# Altium footprint library BBC_Connectors.PcbLib: 142 footprints (part 9 of 9)
Each footprint in its own frame and in the unit in brackets; x right, y up, seen from the top. Pads: shape width x height; smd on the part's side, far side on the other; paste and mask are expansions set on the pad; w line width, h text height; cw(c..) or ccw(c..) is an arc to the next point about the centre after c.
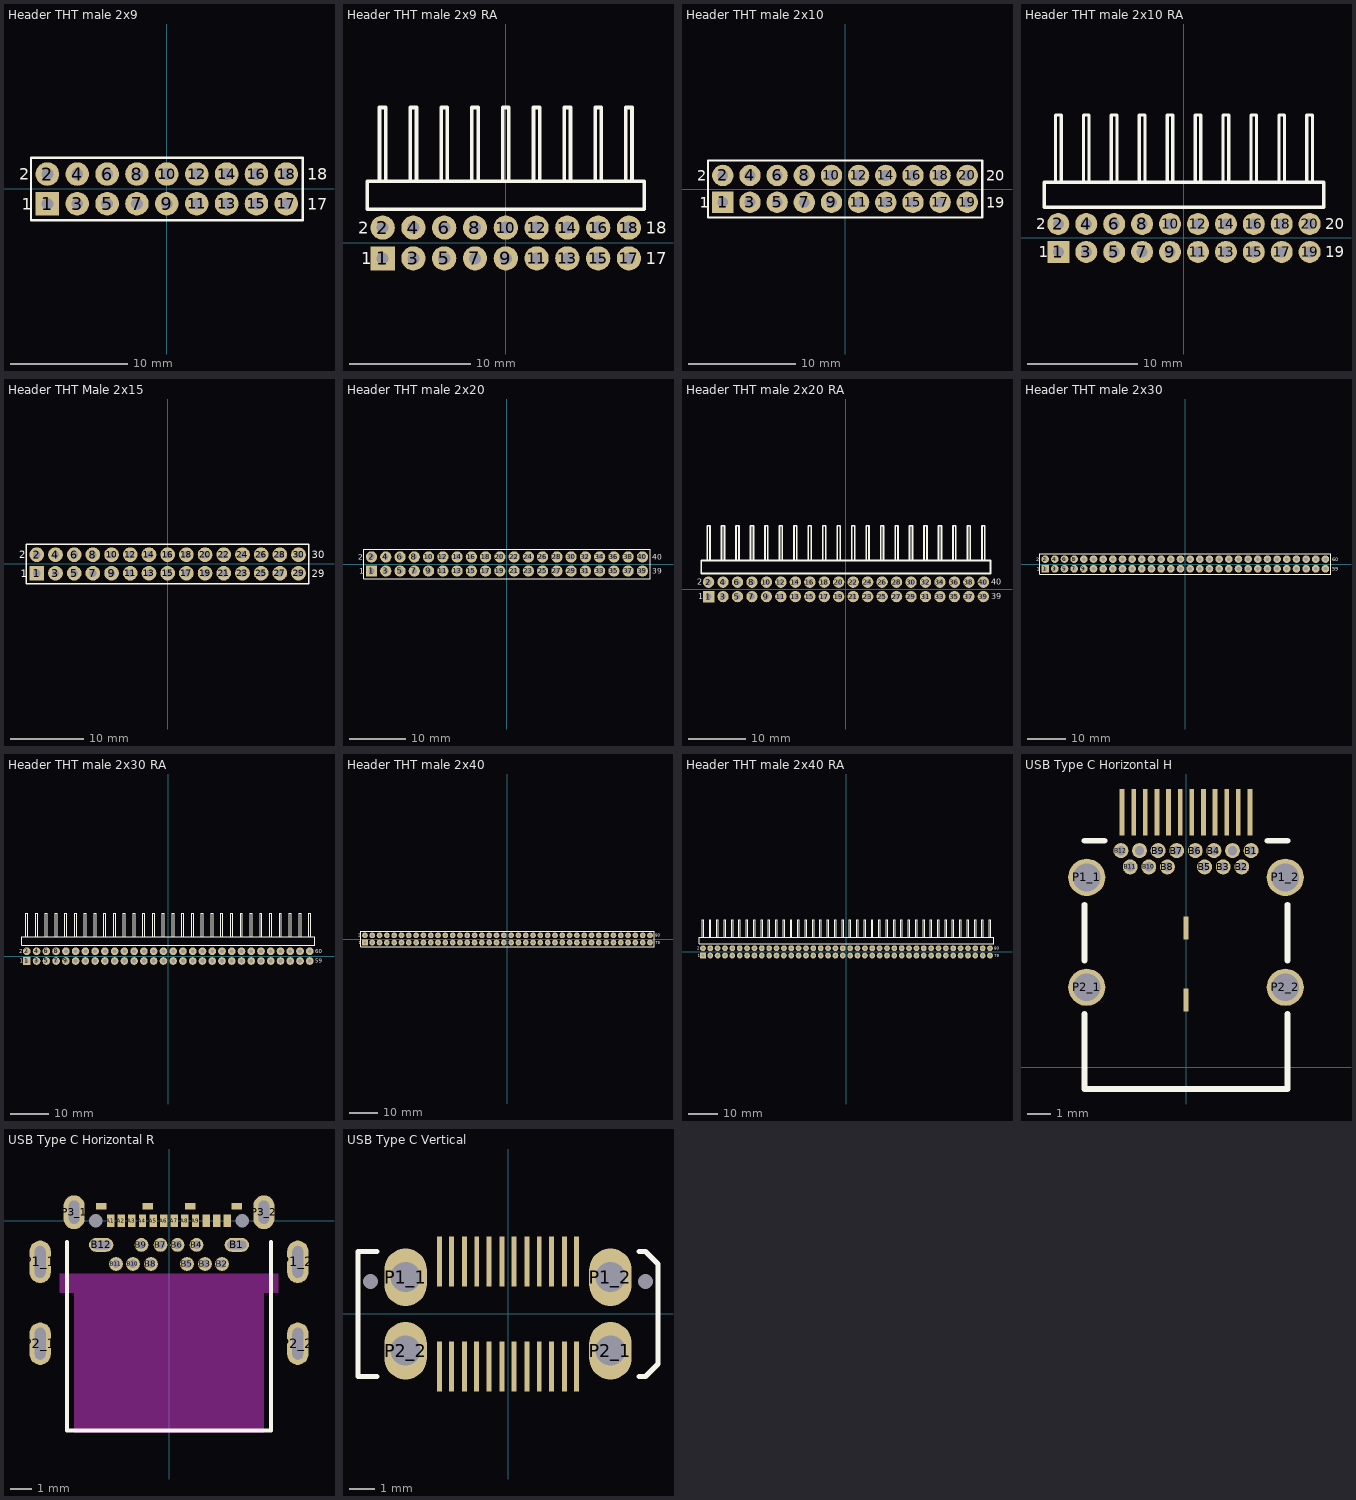
[diagram p8: the footprints below, top view; thin cyan lines are the x and y axes]

## Header THT male 2x9 [mm] "header for tht mounting / pitch = 2.54mm"
height 9
pads (18):
  rect 2x2 hole 1: 1(-10.16,-1.245)
  round 2 hole 1: 2(-10.16,1.27) 3(-7.62,-1.245) 4(-7.62,1.27) 5(-5.08,-1.245) 6(-5.08,1.27) 7(-2.54,-1.245) 8(-2.54,1.27) 9(0,-1.245) 10(0,1.27) 11(2.54,-1.245) 12(2.54,1.27) 13(5.08,-1.245) 14(5.08,1.27) 15(7.62,-1.245) 16(7.62,1.27) 17(10.16,-1.245) 18(10.16,1.27)
Top Overlay:
  lines w0.2: -11.557,-2.667 11.557,-2.667 11.557,2.667 -11.557,2.667 -11.557,-2.667
  text "2" at -12.573,0.77 h1
  text "18" at 11.938,0.77 h1
  text "17" at 11.938,-1.77 h1
  text "1" at -12.319,-1.77 h1
3D body: height 2.51, standoff -3, extent 2.54,3.81 2.54,3.81
3D body "Header THT 2x9.step": height 8.54, standoff -3, extent -11.43,-2.49 11.43,2.5

## Header THT male 2x9 RA [mm] "right angle header for tht mounting / pitch = 2.54mm"
height 2.5
pads (18):
  rect 2x2 hole 1: 1(-10.16,-1.27)
  round 2 hole 1: 2(-10.16,1.27) 3(-7.62,-1.27) 4(-7.62,1.27) 5(-5.08,-1.27) 6(-5.08,1.27) 7(-2.54,-1.27) 8(-2.54,1.27) 9(0,-1.27) 10(0,1.27) 11(2.54,-1.27) 12(2.54,1.27) 13(5.08,-1.27) 14(5.08,1.27) 15(7.62,-1.27) 16(7.62,1.27) 17(10.16,-1.27) 18(10.16,1.27)
Top Overlay:
  lines w0.3: -10.414,5.08 -10.414,11.176 -9.906,11.176 -9.906,5.08 ; -7.874,5.08 -7.874,11.176 -7.366,11.176 -7.366,5.08 ; -5.334,5.08 -5.334,11.176 -4.826,11.176 -4.826,5.08 ; -2.794,5.08 -2.794,11.176 -2.286,11.176 -2.286,5.08 ; -0.254,5.08 -0.254,11.176 0.254,11.176 0.254,5.08 ; 2.286,5.08 2.286,11.176 2.794,11.176 2.794,5.08 ; 4.826,5.08 4.826,11.176 5.334,11.176 5.334,5.08 ; 7.366,5.08 7.366,11.176 7.874,11.176 7.874,5.08 ; 9.906,5.08 9.906,11.176 10.414,11.176 10.414,5.08 ; -11.43,2.794 -11.43,5.08 11.43,5.08 11.43,2.794 -11.43,2.794
  text "17" at 11.557,-1.77 h1
  text "18" at 11.557,0.77 h1
  text "2" at -12.192,0.77 h1
  text "1" at -11.938,-1.77 h1
3D body "Header THT 2x9 RA.step": height 5.01, standoff -3, extent -11.43,-1.55 11.43,11.08

## Header THT male 2x10 [mm] "header for tht mounting / pitch = 2.54mm"
height 9
pads (20):
  rect 2x2 hole 1: 1(-11.43,-1.245)
  round 2 hole 1: 2(-11.43,1.27) 3(-8.89,-1.245) 4(-8.89,1.27) 5(-6.35,-1.245) 6(-6.35,1.27) 7(-3.81,-1.245) 8(-3.81,1.27) 9(-1.27,-1.245) 10(-1.27,1.27) 11(1.27,-1.245) 12(1.27,1.27) 13(3.81,-1.245) 14(3.81,1.27) 15(6.35,-1.245) 16(6.35,1.27) 17(8.89,-1.245) 18(8.89,1.27) 19(11.43,-1.245) 20(11.43,1.27)
Top Overlay:
  lines w0.2: -12.827,-2.667 -12.827,2.667 12.827,2.667 12.827,-2.667 -12.827,-2.667
  text "2" at -13.843,0.77 h1
  text "20" at 13.208,0.77 h1
  text "19" at 13.208,-1.77 h1
  text "1" at -13.589,-1.77 h1
3D body "Header THT 2x10.step": height 8.54, standoff -3, extent -12.7,-2.515 12.7,2.475

## Header THT male 2x10 RA [mm] "right angle header for tht mounting / pitch = 2.54mm"
height 2.5
pads (20):
  rect 2x2 hole 1: 1(-11.43,-1.27)
  round 2 hole 1: 2(-11.43,1.27) 3(-8.89,-1.27) 4(-8.89,1.27) 5(-6.35,-1.27) 6(-6.35,1.27) 7(-3.81,-1.27) 8(-3.81,1.27) 9(-1.27,-1.27) 10(-1.27,1.27) 11(1.27,-1.27) 12(1.27,1.27) 13(3.81,-1.27) 14(3.81,1.27) 15(6.35,-1.27) 16(6.35,1.27) 17(8.89,-1.27) 18(8.89,1.27) 19(11.43,-1.27) 20(11.43,1.27)
Top Overlay:
  lines w0.3: -11.684,5.08 -11.684,11.176 -11.176,11.176 -11.176,5.08 ; -9.144,5.08 -9.144,11.176 -8.636,11.176 -8.636,5.08 ; -6.604,5.08 -6.604,11.176 -6.096,11.176 -6.096,5.08 ; -4.064,5.08 -4.064,11.176 -3.556,11.176 -3.556,5.08 ; -1.524,5.08 -1.524,11.176 -1.016,11.176 -1.016,5.08 ; 1.016,5.08 1.016,11.176 1.524,11.176 1.524,5.08 ; 3.556,5.08 3.556,11.176 4.064,11.176 4.064,5.08 ; 6.096,5.08 6.096,11.176 6.604,11.176 6.604,5.08 ; 8.636,5.08 8.636,11.176 9.144,11.176 9.144,5.08 ; 11.176,5.08 11.176,11.176 11.684,11.176 11.684,5.08 ; -12.7,2.794 -12.7,5.08 12.7,5.08 12.7,2.794 -12.7,2.794
  text "19" at 12.827,-1.77 h1
  text "20" at 12.827,0.77 h1
  text "2" at -13.462,0.77 h1
  text "1" at -13.208,-1.77 h1
3D body "Header THT 2x10 RA.step": height 5.01, standoff -3, extent -12.7,-1.55 12.7,11.08

## Header THT Male 2x15 [mm] "header for tht mounting / pitch = 2.54mm"
height 9
pads (30):
  rect 2x2 hole 1: 1(-17.78,-1.25)
  round 2 hole 1: 2(-17.78,1.265) 3(-15.24,-1.25) 4(-15.24,1.265) 5(-12.7,-1.25) 6(-12.7,1.265) 7(-10.16,-1.25) 8(-10.16,1.265) 9(-7.62,-1.25) 10(-7.62,1.265) 11(-5.08,-1.25) 12(-5.08,1.265) 13(-2.54,-1.25) 14(-2.54,1.265) 15(0,-1.25) 16(0,1.265) 17(2.54,-1.25) 18(2.54,1.265) 19(5.08,-1.25) 20(5.08,1.265) 21(7.62,-1.25) 22(7.62,1.265) 23(10.16,-1.25) 24(10.16,1.265) 25(12.7,-1.25) 26(12.7,1.265) 27(15.24,-1.25) 28(15.24,1.265) 29(17.78,-1.25) 30(17.78,1.265)
Top Overlay:
  lines w0.2: -19.177,-2.672 19.177,-2.672 19.177,2.662 -19.177,2.662 -19.177,-2.672
  text "2" at -20.193,0.765 h1
  text "30" at 19.558,0.765 h1
  text "29" at 19.558,-1.775 h1
  text "1" at -19.939,-1.775 h1
3D body "Header THT male 2x5.step": height 8.54, standoff -3, extent -19.05,-2.52 -6.35,2.47
3D body "Header THT male 2x10.step": height 8.54, standoff -3, extent -6.35,-2.495 19.05,2.495

## Header THT male 2x20 [mm] "header for tht mounting / pitch = 2.54mm"
height 9
pads (40):
  rect 2x2 hole 1: 1(-24.13,-1.245)
  round 2 hole 1: 2(-24.13,1.27) 3(-21.59,-1.245) 4(-21.59,1.27) 5(-19.05,-1.245) 6(-19.05,1.27) 7(-16.51,-1.245) 8(-16.51,1.27) 9(-13.97,-1.245) 10(-13.97,1.27) 11(-11.43,-1.245) 12(-11.43,1.27) 13(-8.89,-1.245) 14(-8.89,1.27) 15(-6.35,-1.245) 16(-6.35,1.27) 17(-3.81,-1.245) 18(-3.81,1.27) 19(-1.27,-1.245) 20(-1.27,1.27) 21(1.27,-1.245) 22(1.27,1.27) 23(3.81,-1.245) 24(3.81,1.27) 25(6.35,-1.245) 26(6.35,1.27) 27(8.89,-1.245) 28(8.89,1.27) 29(11.43,-1.245) 30(11.43,1.27) 31(13.97,-1.245) 32(13.97,1.27) 33(16.51,-1.245) 34(16.51,1.27) 35(19.05,-1.245) 36(19.05,1.27) 37(21.59,-1.245) 38(21.59,1.27) 39(24.13,-1.245) 40(24.13,1.27)
Top Overlay:
  lines w0.2: -25.527,-2.667 25.527,-2.667 25.527,2.667 -25.527,2.667 -25.527,-2.667
  text "40" at 25.908,0.77 h1
  text "39" at 25.908,-1.77 h1
  text "2" at -26.543,0.77 h1
  text "1" at -26.289,-1.77 h1
3D body "Header THT 2x20.step": height 8.54, standoff -3, extent -25.4,-2.49 25.4,2.5

## Header THT male 2x20 RA [mm] "right angle header for tht mounting / pitch = 2.54mm"
height 2.5
pads (40):
  rect 2x2 hole 1: 1(-24.13,-1.27)
  round 2 hole 1: 2(-24.13,1.27) 3(-21.59,-1.27) 4(-21.59,1.27) 5(-19.05,-1.27) 6(-19.05,1.27) 7(-16.51,-1.27) 8(-16.51,1.27) 9(-13.97,-1.27) 10(-13.97,1.27) 11(-11.43,-1.27) 12(-11.43,1.27) 13(-8.89,-1.27) 14(-8.89,1.27) 15(-6.35,-1.27) 16(-6.35,1.27) 17(-3.81,-1.27) 18(-3.81,1.27) 19(-1.27,-1.27) 20(-1.27,1.27) 21(1.27,-1.27) 22(1.27,1.27) 23(3.81,-1.27) 24(3.81,1.27) 25(6.35,-1.27) 26(6.35,1.27) 27(8.89,-1.27) 28(8.89,1.27) 29(11.43,-1.27) 30(11.43,1.27) 31(13.97,-1.27) 32(13.97,1.27) 33(16.51,-1.27) 34(16.51,1.27) 35(19.05,-1.27) 36(19.05,1.27) 37(21.59,-1.27) 38(21.59,1.27) 39(24.13,-1.27) 40(24.13,1.27)
Top Overlay:
  lines w0.3: -24.384,5.08 -24.384,11.176 -23.876,11.176 -23.876,5.08 ; -21.844,5.08 -21.844,11.176 -21.336,11.176 -21.336,5.08 ; -19.304,5.08 -19.304,11.176 -18.796,11.176 -18.796,5.08 ; -16.764,5.08 -16.764,11.176 -16.256,11.176 -16.256,5.08 ; -14.224,5.08 -14.224,11.176 -13.716,11.176 -13.716,5.08 ; -11.684,5.08 -11.684,11.176 -11.176,11.176 -11.176,5.08 ; -9.144,5.08 -9.144,11.176 -8.636,11.176 -8.636,5.08 ; -6.604,5.08 -6.604,11.176 -6.096,11.176 -6.096,5.08 ; -4.064,5.08 -4.064,11.176 -3.556,11.176 -3.556,5.08 ; -1.524,5.08 -1.524,11.176 -1.016,11.176 -1.016,5.08 ; 1.016,5.08 1.016,11.176 1.524,11.176 1.524,5.08 ; 3.556,5.08 3.556,11.176 4.064,11.176 4.064,5.08 ; 6.096,5.08 6.096,11.176 6.604,11.176 6.604,5.08 ; 8.636,5.08 8.636,11.176 9.144,11.176 9.144,5.08 ; 11.176,5.08 11.176,11.176 11.684,11.176 11.684,5.08 ; 13.716,5.08 13.716,11.176 14.224,11.176 14.224,5.08 ; 16.256,5.08 16.256,11.176 16.764,11.176 16.764,5.08 ; 18.796,5.08 18.796,11.176 19.304,11.176 19.304,5.08 ; 21.336,5.08 21.336,11.176 21.844,11.176 21.844,5.08 ; 23.876,5.08 23.876,11.176 24.384,11.176 24.384,5.08 ; -25.4,2.794 -25.4,5.08 25.4,5.08 25.4,2.794 -25.4,2.794
  text "39" at 25.527,-1.77 h1
  text "40" at 25.527,0.77 h1
  text "2" at -26.162,0.77 h1
  text "1" at -25.908,-1.77 h1
3D body "Header THT 2x20 RA.step": height 5.01, standoff -3, extent -25.4,-1.55 25.4,11.08

## Header THT male 2x30 [mm] "header for tht mounting / pitch = 2.54mm"
height 9
pads (60):
  rect 2x2 hole 1: 1(-36.83,-1.245)
  round 2 hole 1: 2(-36.83,1.27) 3(-34.29,-1.245) 4(-34.29,1.27) 5(-31.75,-1.245) 6(-31.75,1.27) 7(-29.21,-1.245) 8(-29.21,1.27) 9(-26.67,-1.245) 10(-26.67,1.27) 11(-24.13,-1.245) 12(-24.13,1.27) 13(-21.59,-1.245) 14(-21.59,1.27) 15(-19.05,-1.245) 16(-19.05,1.27) 17(-16.51,-1.245) 18(-16.51,1.27) 19(-13.97,-1.245) 20(-13.97,1.27) 21(-11.43,-1.245) 22(-11.43,1.27) 23(-8.89,-1.245) 24(-8.89,1.27) 25(-6.35,-1.245) 26(-6.35,1.27) 27(-3.81,-1.245) 28(-3.81,1.27) 29(-1.27,-1.245) 30(-1.27,1.27) 31(1.27,-1.245) 32(1.27,1.27) 33(3.81,-1.245) 34(3.81,1.27) 35(6.35,-1.245) 36(6.35,1.27) 37(8.89,-1.245) 38(8.89,1.27) 39(11.43,-1.245) 40(11.43,1.27) 41(13.97,-1.245) 42(13.97,1.27) 43(16.51,-1.245) 44(16.51,1.27) 45(19.05,-1.245) 46(19.05,1.27) 47(21.59,-1.245) 48(21.59,1.27) 49(24.13,-1.245) 50(24.13,1.27) 51(26.67,-1.245) 52(26.67,1.27) 53(29.21,-1.245) 54(29.21,1.27) 55(31.75,-1.245) 56(31.75,1.27) 57(34.29,-1.245) 58(34.29,1.27) 59(36.83,-1.245) 60(36.83,1.27)
Top Overlay:
  lines w0.2: -38.227,-2.667 38.227,-2.667 38.227,2.667 -38.227,2.667 -38.227,-2.667
  text "1" at -38.989,-1.77 h1
  text "59" at 38.608,-1.77 h1
  text "60" at 38.608,0.77 h1
  text "2" at -39.243,0.77 h1
3D body "Header THT 2x30.step": height 8.54, standoff -3, extent -38.1,-2.49 38.1,2.5
3D body: height 2.51, standoff -3, extent 2.54,3.81 2.54,3.81

## Header THT male 2x30 RA [mm] "right angle header for tht mounting / pitch = 2.54mm"
height 2.5
pads (60):
  rect 2x2 hole 1: 1(-36.83,-1.27)
  round 2 hole 1: 2(-36.83,1.27) 3(-34.29,-1.27) 4(-34.29,1.27) 5(-31.75,-1.27) 6(-31.75,1.27) 7(-29.21,-1.27) 8(-29.21,1.27) 9(-26.67,-1.27) 10(-26.67,1.27) 11(-24.13,-1.27) 12(-24.13,1.27) 13(-21.59,-1.27) 14(-21.59,1.27) 15(-19.05,-1.27) 16(-19.05,1.27) 17(-16.51,-1.27) 18(-16.51,1.27) 19(-13.97,-1.27) 20(-13.97,1.27) 21(-11.43,-1.27) 22(-11.43,1.27) 23(-8.89,-1.27) 24(-8.89,1.27) 25(-6.35,-1.27) 26(-6.35,1.27) 27(-3.81,-1.27) 28(-3.81,1.27) 29(-1.27,-1.27) 30(-1.27,1.27) 31(1.27,-1.27) 32(1.27,1.27) 33(3.81,-1.27) 34(3.81,1.27) 35(6.35,-1.27) 36(6.35,1.27) 37(8.89,-1.27) 38(8.89,1.27) 39(11.43,-1.27) 40(11.43,1.27) 41(13.97,-1.27) 42(13.97,1.27) 43(16.51,-1.27) 44(16.51,1.27) 45(19.05,-1.27) 46(19.05,1.27) 47(21.59,-1.27) 48(21.59,1.27) 49(24.13,-1.27) 50(24.13,1.27) 51(26.67,-1.27) 52(26.67,1.27) 53(29.21,-1.27) 54(29.21,1.27) 55(31.75,-1.27) 56(31.75,1.27) 57(34.29,-1.27) 58(34.29,1.27) 59(36.83,-1.27) 60(36.83,1.27)
Top Overlay:
  lines w0.3: -37.084,5.08 -37.084,11.176 -36.576,11.176 -36.576,5.08 ; -34.544,5.08 -34.544,11.176 -34.036,11.176 -34.036,5.08 ; -32.004,5.08 -32.004,11.176 -31.496,11.176 -31.496,5.08 ; -29.464,5.08 -29.464,11.176 -28.956,11.176 -28.956,5.08 ; -26.924,5.08 -26.924,11.176 -26.416,11.176 -26.416,5.08 ; -24.384,5.08 -24.384,11.176 -23.876,11.176 -23.876,5.08 ; -21.844,5.08 -21.844,11.176 -21.336,11.176 -21.336,5.08 ; -19.304,5.08 -19.304,11.176 -18.796,11.176 -18.796,5.08 ; -16.764,5.08 -16.764,11.176 -16.256,11.176 -16.256,5.08 ; -14.224,5.08 -14.224,11.176 -13.716,11.176 -13.716,5.08 ; -11.684,5.08 -11.684,11.176 -11.176,11.176 -11.176,5.08 ; -9.144,5.08 -9.144,11.176 -8.636,11.176 -8.636,5.08 ; -6.604,5.08 -6.604,11.176 -6.096,11.176 -6.096,5.08 ; -4.064,5.08 -4.064,11.176 -3.556,11.176 -3.556,5.08 ; -1.524,5.08 -1.524,11.176 -1.016,11.176 -1.016,5.08 ; 1.016,5.08 1.016,11.176 1.524,11.176 1.524,5.08 ; 3.556,5.08 3.556,11.176 4.064,11.176 4.064,5.08 ; 6.096,5.08 6.096,11.176 6.604,11.176 6.604,5.08 ; 8.636,5.08 8.636,11.176 9.144,11.176 9.144,5.08 ; 11.176,5.08 11.176,11.176 11.684,11.176 11.684,5.08 ; 13.716,5.08 13.716,11.176 14.224,11.176 14.224,5.08 ; 16.256,5.08 16.256,11.176 16.764,11.176 16.764,5.08 ; 18.796,5.08 18.796,11.176 19.304,11.176 19.304,5.08 ; 21.336,5.08 21.336,11.176 21.844,11.176 21.844,5.08 ; 23.876,5.08 23.876,11.176 24.384,11.176 24.384,5.08 ; 26.416,5.08 26.416,11.176 26.924,11.176 26.924,5.08 ; 28.956,5.08 28.956,11.176 29.464,11.176 29.464,5.08 ; 31.496,5.08 31.496,11.176 32.004,11.176 32.004,5.08 ; 34.036,5.08 34.036,11.176 34.544,11.176 34.544,5.08 ; 36.576,5.08 36.576,11.176 37.084,11.176 37.084,5.08 ; -38.1,2.794 38.1,2.794 38.1,5.08 -38.1,5.08 -38.1,2.794
  text "1" at -38.608,-1.77 h1
  text "2" at -38.862,0.77 h1
  text "60" at 38.227,0.77 h1
  text "59" at 38.227,-1.77 h1
3D body "Header THT 2x30  RA.step": height 5.01, standoff -3, extent -38.1,-1.55 38.1,11.08

## Header THT male 2x40 [mm] "header for tht mounting / pitch = 2.54mm"
height 9
pads (80):
  rect 2x2 hole 1: 1(-49.53,-1.245)
  round 2 hole 1: 2(-49.53,1.27) 3(-46.99,-1.245) 4(-46.99,1.27) 5(-44.45,-1.245) 6(-44.45,1.27) 7(-41.91,-1.245) 8(-41.91,1.27) 9(-39.37,-1.245) 10(-39.37,1.27) 11(-36.83,-1.245) 12(-36.83,1.27) 13(-34.29,-1.245) 14(-34.29,1.27) 15(-31.75,-1.245) 16(-31.75,1.27) 17(-29.21,-1.245) 18(-29.21,1.27) 19(-26.67,-1.245) 20(-26.67,1.27) 21(-24.13,-1.245) 22(-24.13,1.27) 23(-21.59,-1.245) 24(-21.59,1.27) 25(-19.05,-1.245) 26(-19.05,1.27) 27(-16.51,-1.245) 28(-16.51,1.27) 29(-13.97,-1.245) 30(-13.97,1.27) 31(-11.43,-1.245) 32(-11.43,1.27) 33(-8.89,-1.245) 34(-8.89,1.27) 35(-6.35,-1.245) 36(-6.35,1.27) 37(-3.81,-1.245) 38(-3.81,1.27) 39(-1.27,-1.245) 40(-1.27,1.27) 41(1.27,-1.245) 42(1.27,1.27) 43(3.81,-1.245) 44(3.81,1.27) 45(6.35,-1.245) 46(6.35,1.27) 47(8.89,-1.245) 48(8.89,1.27) 49(11.43,-1.245) 50(11.43,1.27) 51(13.97,-1.245) 52(13.97,1.27) 53(16.51,-1.245) 54(16.51,1.27) 55(19.05,-1.245) 56(19.05,1.27) 57(21.59,-1.245) 58(21.59,1.27) 59(24.13,-1.245) 60(24.13,1.27) 61(26.67,-1.245) 62(26.67,1.27) 63(29.21,-1.245) 64(29.21,1.27) 65(31.75,-1.245) 66(31.75,1.27) 67(34.29,-1.245) 68(34.29,1.27) 69(36.83,-1.245) 70(36.83,1.27) 71(39.37,-1.245) 72(39.37,1.27) 73(41.91,-1.245) 74(41.91,1.27) 75(44.45,-1.245) 76(44.45,1.27) 77(46.99,-1.245) 78(46.99,1.27) 79(49.53,-1.245) 80(49.53,1.27)
Top Overlay:
  lines w0.2: 50.927,2.667 50.927,-2.667 -50.927,-2.667 -50.927,2.667 50.927,2.667 ; 50.927,2.667 50.927,2.667
  text "2" at -51.943,0.77 h1
  text "80" at 51.308,0.77 h1
  text "79" at 51.308,-1.77 h1
  text "1" at -51.689,-1.77 h1
3D body: height 2.51, standoff -3, extent 2.54,3.81 2.54,3.81
3D body "Header THT 2x40.step": height 8.54, standoff -3, extent -50.8,-2.49 50.8,2.5

## Header THT male 2x40 RA [mm] "right angle header for tht mounting / pitch = 2.54mm"
height 2.5
pads (80):
  rect 2x2 hole 1: 1(-49.53,-1.27)
  round 2 hole 1: 2(-49.53,1.27) 3(-46.99,-1.27) 4(-46.99,1.27) 5(-44.45,-1.27) 6(-44.45,1.27) 7(-41.91,-1.27) 8(-41.91,1.27) 9(-39.37,-1.27) 10(-39.37,1.27) 11(-36.83,-1.27) 12(-36.83,1.27) 13(-34.29,-1.27) 14(-34.29,1.27) 15(-31.75,-1.27) 16(-31.75,1.27) 17(-29.21,-1.27) 18(-29.21,1.27) 19(-26.67,-1.27) 20(-26.67,1.27) 21(-24.13,-1.27) 22(-24.13,1.27) 23(-21.59,-1.27) 24(-21.59,1.27) 25(-19.05,-1.27) 26(-19.05,1.27) 27(-16.51,-1.27) 28(-16.51,1.27) 29(-13.97,-1.27) 30(-13.97,1.27) 31(-11.43,-1.27) 32(-11.43,1.27) 33(-8.89,-1.27) 34(-8.89,1.27) 35(-6.35,-1.27) 36(-6.35,1.27) 37(-3.81,-1.27) 38(-3.81,1.27) 39(-1.27,-1.27) 40(-1.27,1.27) 41(1.27,-1.27) 42(1.27,1.27) 43(3.81,-1.27) 44(3.81,1.27) 45(6.35,-1.27) 46(6.35,1.27) 47(8.89,-1.27) 48(8.89,1.27) 49(11.43,-1.27) 50(11.43,1.27) 51(13.97,-1.27) 52(13.97,1.27) 53(16.51,-1.27) 54(16.51,1.27) 55(19.05,-1.27) 56(19.05,1.27) 57(21.59,-1.27) 58(21.59,1.27) 59(24.13,-1.27) 60(24.13,1.27) 61(26.67,-1.27) 62(26.67,1.245) 63(29.21,-1.27) 64(29.21,1.245) 65(31.75,-1.27) 66(31.75,1.245) 67(34.29,-1.27) 68(34.29,1.245) 69(36.83,-1.27) 70(36.83,1.245) 71(39.37,-1.27) 72(39.37,1.245) 73(41.91,-1.27) 74(41.91,1.245) 75(44.45,-1.27) 76(44.45,1.245) 77(46.99,-1.27) 78(46.99,1.245) 79(49.53,-1.27) 80(49.53,1.245)
Top Overlay:
  lines w0.3: -49.784,5.08 -49.784,11.176 -49.276,11.176 -49.276,5.08 ; -47.244,5.08 -47.244,11.176 -46.736,11.176 -46.736,5.08 ; -44.704,5.08 -44.704,11.176 -44.196,11.176 -44.196,5.08 ; -42.164,5.08 -42.164,11.176 -41.656,11.176 -41.656,5.08 ; -39.624,5.08 -39.624,11.176 -39.116,11.176 -39.116,5.08 ; -37.084,5.08 -37.084,11.176 -36.576,11.176 -36.576,5.08 ; -34.544,5.08 -34.544,11.176 -34.036,11.176 -34.036,5.08 ; -32.004,5.08 -32.004,11.176 -31.496,11.176 -31.496,5.08 ; -29.464,5.08 -29.464,11.176 -28.956,11.176 -28.956,5.08 ; -26.924,5.08 -26.924,11.176 -26.416,11.176 -26.416,5.08 ; -24.384,5.08 -24.384,11.176 -23.876,11.176 -23.876,5.08 ; -21.844,5.08 -21.844,11.176 -21.336,11.176 -21.336,5.08 ; -19.304,5.08 -19.304,11.176 -18.796,11.176 -18.796,5.08 ; -16.764,5.08 -16.764,11.176 -16.256,11.176 -16.256,5.08 ; -14.224,5.08 -14.224,11.176 -13.716,11.176 -13.716,5.08 ; -11.684,5.08 -11.684,11.176 -11.176,11.176 -11.176,5.08 ; -9.144,5.08 -9.144,11.176 -8.636,11.176 -8.636,5.08 ; -6.604,5.08 -6.604,11.176 -6.096,11.176 -6.096,5.08 ; -4.064,5.08 -4.064,11.176 -3.556,11.176 -3.556,5.08 ; -1.524,5.08 -1.524,11.176 -1.016,11.176 -1.016,5.08 ; 1.016,5.08 1.016,11.176 1.524,11.176 1.524,5.08 ; 3.556,5.08 3.556,11.176 4.064,11.176 4.064,5.08 ; 6.096,5.08 6.096,11.176 6.604,11.176 6.604,5.08 ; 8.636,5.08 8.636,11.176 9.144,11.176 9.144,5.08 ; 11.176,5.08 11.176,11.176 11.684,11.176 11.684,5.08 ; 13.716,5.08 13.716,11.176 14.224,11.176 14.224,5.08 ; 16.256,5.08 16.256,11.176 16.764,11.176 16.764,5.08 ; 18.796,5.08 18.796,11.176 19.304,11.176 19.304,5.08 ; 21.336,5.08 21.336,11.176 21.844,11.176 21.844,5.08 ; 23.876,5.08 23.876,11.176 24.384,11.176 24.384,5.08 ; 26.416,5.08 26.416,11.176 26.924,11.176 26.924,5.08 ; 28.956,5.08 28.956,11.176 29.464,11.176 29.464,5.08 ; 31.496,5.08 31.496,11.176 32.004,11.176 32.004,5.08 ; 34.036,5.08 34.036,11.176 34.544,11.176 34.544,5.08 ; 36.576,5.08 36.576,11.176 37.084,11.176 37.084,5.08 ; 39.116,5.055 39.116,11.151 39.624,11.151 39.624,5.055 ; 41.656,5.055 41.656,11.151 42.164,11.151 42.164,5.055 ; 44.196,5.055 44.196,11.151 44.704,11.151 44.704,5.055 ; 46.736,5.055 46.736,11.151 47.244,11.151 47.244,5.055 ; 49.276,5.055 49.276,11.151 49.784,11.151 49.784,5.055 ; -50.8,2.794 50.8,2.794 50.8,5.08 -50.8,5.08 -50.8,2.794
  text "1" at -51.308,-1.77 h1
  text "2" at -51.562,0.77 h1
  text "80" at 50.927,0.77 h1
  text "79" at 50.927,-1.77 h1
3D body "Header THT 2x40 RA.step": height 5.01, standoff -3, extent -50.8,-1.55 50.8,11.08

## USB Type C Horizontal H [mm] "Manufacturer Part Number: Würth Elektronik 632723100011"
pads (32):
  rect 0.2x2 smd mask+0.07: A1(-2.75,10.98) A2(-2.25,10.98) A3(-1.75,10.98) A4(-1.25,10.98) A5(-0.75,10.98) A6(-0.25,10.98) A7(0.25,10.98) A8(0.75,10.98) A9(1.25,10.98) A10(1.75,10.98) A11(2.25,10.98) A12(2.75,10.98)
  oval 0.64x0.65 hole 0.4 mask+0: B1(2.8,9.33) B2(2.4,8.63) B3(1.6,8.63) B4(1.2,9.33) B5(0.8,8.63) B6(0.4,9.33) B7(-0.4,9.33) B8(-0.8,8.63) B9(-1.2,9.33) B10(-1.6,8.63) B11(-2.4,8.63) B12(-2.8,9.33) ""(-2,9.33) ""(2,9.33)
  round 1.6 hole 1.2 mask+0: P1_1(-4.27,8.18) P1_2(4.27,8.18) P2_1(-4.27,3.45) P2_2(4.27,3.45)
  rect 0.2x1 smd mask+0.07: ""(0,2.9) ""(0,6)
Top Overlay:
  lines w0.25: -4.37,2.3 -4.37,-0.925 4.37,-0.925 4.37,2.3 ; -4.37,4.6 -4.37,7 ; -4.37,9.75 -3.5,9.75 ; 3.5,9.75 4.37,9.75 ; 4.37,4.6 4.37,7
3D body "632723100011.stp": height 3.04, standoff -1.82, extent -4.37,-0.925 4.37,10.869

## USB Type C Horizontal R [mm] "Manufacturer Part Number: 2129691-1"
height 5
pads (36):
  round 0 hole 0.65: 26(-3.45,0) 26(3.45,0)
  rect 0.35x0.6 smd mask+0.05: A1(-2.75,0) A2(-2.25,0) A3(-1.75,0) A4(-1.25,0) A5(-0.75,0) A6(-0.25,0) A7(0.25,0) A8(0.75,0) A9(1.25,0) A10(1.75,0) A11(2.25,0) A12(2.75,0)
  oval 1.15x0.65 hole 0.9 slot 0.4 at 90 deg: B1(3.2,-1.14) B12(-3.2,-1.14)
  round 0.65 hole 0.4 mask+0.05: B2(2.5,-2.04) B3(1.7,-2.04) B4(1.3,-1.14) B5(0.85,-2.04) B6(0.4,-1.14) B7(-0.4,-1.14) B8(-0.85,-2.04) B9(-1.3,-1.14) B10(-1.7,-2.04) B11(-2.5,-2.04)
  oval 1x2 hole 1.5 slot 0.5 at 0 deg: P1_1(-6.075,-1.94) P1_2(6.075,-1.94) P2_1(-6.075,-5.8) P2_2(6.075,-5.8)
  oval 1x1.6 hole 1.1 slot 0.5 at 0 deg: P3_1(-4.475,0.4) P3_2(4.475,0.4)
  rect 0.5x0.3 smd mask+0.05: ""(-3.2,0.69) ""(-1,0.69) ""(1,0.69) ""(3.2,0.69)
Top Overlay:
  pour cut-out: 0,-2.5
  lines w0.2: -4.812,-1 -4.812,-9.9 0,-9.9 4.812,-9.9 ; 4.812,-1 4.812,-9.9 ; 4.812,-9.9 4.812,-9.9
Keep-Out Layer:
  board cut-out: -5.15,-2.5 -5.15,-3.4 -4.475,-3.4 -4.475,-10 4.475,-10 4.475,-3.4 5.15,-3.4 5.15,-2.5
3D body "67172.stp": height 2.27, standoff -1.07, extent -6.175,-9.9 6.175,0.8

## USB Type C Vertical [mm] "Manufacturer Part Number: DX07S024WJ1R350"
height 15
pads (30):
  rect 0.2x2 smd: A1(-2.75,2.1) A2(-2.25,2.1) A3(-1.75,2.1) A4(-1.25,2.1) A5(-0.75,2.1) A6(-0.25,2.1) A7(0.25,2.1) A8(0.75,2.1) A9(1.25,2.1) A10(1.75,2.1) A11(2.25,2.1) A12(2.75,2.1) B1(2.75,-2.1) B2(2.25,-2.1) B3(1.75,-2.1) B4(1.25,-2.1) B5(0.75,-2.1) B6(0.25,-2.1) B7(-0.25,-2.1) B8(-0.75,-2.1) B9(-1.25,-2.1) B10(-1.75,-2.1) B11(-2.25,-2.1) B12(-2.75,-2.1)
  oval 1.7x2.3 hole 1.2: P1_1(-4.1,1.47) P1_2(4.1,1.47) P2_1(4.1,-1.47) P2_2(-4.1,-1.47)
  round 0 hole 0.6: ""(-5.5,1.3) ""(5.5,1.3)
Top Overlay:
  lines w0.2: -5.25,-2.5 -6,-2.5 -6,2.5 -5.25,2.5 ; 5.25,-2.5 5.5,-2.5 6,-2 6,2 5.5,2.5 5.25,2.5
3D body "K3D-DX07S024WJ3-V2_JAE_Proprietary.STEP": height 10, standoff -1.8, extent -6,-2.5 6,2.5